# Altium footprint library Miscellaneous THD.PcbLib: 216 footprints (part 11 of 15) (continued)
## RADIALL_R694252107_a [mm] "COAXIPAK 2 Series, 6 Ways 50 ohm RF Coaxial Right Angle Jack Module" (continued)
Mechanical 14:
  lines w0.1: 5,-5.7 -2.8,-5.7 -2.8,-2.3 5,-2.3 ; 5,-3.4 16.55,-3.4 ; 5,-2.6 16.55,-2.6 ; 5,-1.7 -2.8,-1.7 -2.8,1.7 5,1.7 ; 5,2.3 -2.8,2.3 -2.8,5.7 5,5.7 ; 5,2.4 16.55,2.4 ; 5,3.6 16.55,3.6 ; 16.55,-5.975 16.55,5.975 ; 5,-5.975 17.45,-5.975 17.45,5.975 5,5.975 5,-5.975
  text "A" at 1.6,-7.3 h1
  text "B" at -0.564,-7.25 h1
  text "1C" at -4.95,-4.45 h1
  text "1B" at -4.95,-0.45 h1
  text "1A" at -4.95,3.55 h1
3D body "RADIALL_R694252107.stp": height 9.3, standoff -3.05, extent -2.8,-5.975 17.45,5.975

## ROXBURGH_RIX0142P [mm] "1A 250VAC PCB Mounted Inlet Filter IEC Connector"
height 25.2
pads (4):
  round 2.7 hole 2: 1(10.3,10.75) 3(-10.3,10.75)
  round 2.3 hole 1.6: 2(-9.3,-10.55) 2(9.3,-10.55)
Top Overlay:
  lines w0.2: -15,-16.45 -15,16.85 cw(c-13,16.85) -13,18.85 13,18.85 cw(c13,16.85) 15,16.85 15,-16.45 ; -14.75,-20.15 -14.75,-21.65 ccw(c-13.75,-21.65) -13.75,-22.65 13.75,-22.65 ccw(c13.75,-21.65) 14.75,-21.65 14.75,-20.15 ; -10.3,-13.357 -8.3,-13.357 ; -10,-13.757 -8.6,-13.757 ; -9.7,-14.157 -9,-14.157 ; -9.3,-13.357 -9.3,-12.757 ; 8.3,-13.357 10.3,-13.357 ; 8.6,-13.757 10,-13.757 ; 8.9,-14.157 9.6,-14.157 ; 9.3,-13.357 9.3,-12.757 ; -25,-20.15 25,-20.15 25,-16.45 -25,-16.45 -25,-20.15
  text "L" at 9.943,6.525 h1.5
  text "N" at -10.802,6.325 h1.5
Mechanical 8:
  lines w0.05: -10.8,10.75 -10.3,10.75 ; -10.3,10.25 -10.3,10.75 ; -10.3,11.25 -10.3,10.75 ; -9.8,-10.55 -9.3,-10.55 ; -9.8,10.75 -10.3,10.75 ; -9.3,-11.05 -9.3,-10.55 ; -9.3,-10.05 -9.3,-10.55 ; -8.8,-10.55 -9.3,-10.55 ; -0.5,0 0,0 ; 0,-0.5 0,0 ; 0,0.5 0,0 ; 0.5,0 0,0 ; 8.8,-10.55 9.3,-10.55 ; 9.3,-11.05 9.3,-10.55 ; 9.3,-10.05 9.3,-10.55 ; 9.8,-10.55 9.3,-10.55 ; 9.8,10.75 10.3,10.75 ; 10.3,10.25 10.3,10.75 ; 10.3,11.25 10.3,10.75 ; 10.8,10.75 10.3,10.75
Mechanical 14:
  lines w0.1: -15,-16.45 -15,16.85 cw(c-13,16.85) -13,18.85 13,18.85 cw(c13,16.85) 15,16.85 15,-16.45 ; -14.75,-20.15 -14.75,-21.65 ccw(c-13.75,-21.65) -13.75,-22.65 13.75,-22.65 ccw(c13.75,-21.65) 14.75,-21.65 14.75,-20.15 ; -10.3,-13.357 -8.3,-13.357 ; -10,-13.757 -8.6,-13.757 ; -9.7,-14.157 -9,-14.157 ; -9.3,-13.357 -9.3,-12.757 ; 8.3,-13.357 10.3,-13.357 ; 8.6,-13.757 10,-13.757 ; 8.9,-14.157 9.6,-14.157 ; 9.3,-13.357 9.3,-12.757 ; -25,-20.15 25,-20.15 25,-16.45 -25,-16.45 -25,-20.15
  text "L" at 9.943,6.525 h1.5
  text "N" at -10.802,6.325 h1.5
3D body "ROXBURGH_RIX0142P.stp": height 26.27, standoff -4.4, extent -25.013,-22.55 24.987,18.85

## SCHURTER_DD21.0121.1111 [mm] "IEC Appliance Inlet C14 with Line Switch 2-Pole, Fuseholder 2-Pole, for PCB Mounting"
height 32.3
pads (5):
  round 2.2 hole 1.5: 1(17.65,-9.55) 3(11.65,-9.55)
  round 2.4 hole 1.7: 2(-17.55,-9.55)
  round 5.8 hole 3.4: 4(-28,0) 5(28,0)
Top Overlay:
  drawing of 222 lines, arcs and shapes, not listed
  text "L" at 17.578,-12.875 h1.5
  text "N" at 11.025,-12.95 h1.5
  text "PE" at -18.375,-17.975 h1.5
Mechanical 8:
  circle w0.1: c17.65,-9.55 r0.65
  circle w0.1: c11.65,-9.55 r0.65
  circle w0.1: c-17.55,-9.55 r0.8
  circle w0.1: c28,0 r1.8
  circle w0.1: c-28,0 r1.8
  lines w0.1: -28.5,0 -28,0 ; -28,-0.5 -28,0 ; -28,0.5 -28,0 ; -27.5,0 -28,0 ; -18.05,-9.55 -17.55,-9.55 ; -17.55,-10.05 -17.55,-9.55 ; -17.55,-9.05 -17.55,-9.55 ; -17.05,-9.55 -17.55,-9.55 ; -0.5,0 0,0 ; 0,-0.5 0,0 ; 0,0.5 0,0 ; 0.5,0 0,0 ; 1.45,0.95 1.95,0.95 ; 1.95,0.45 1.95,0.95 ; 1.95,1.45 1.95,0.95 ; 2.45,0.95 1.95,0.95 ; 11.15,-9.55 11.65,-9.55 ; 11.65,-10.05 11.65,-9.55 ; 11.65,-9.05 11.65,-9.55 ; 12.15,-9.55 11.65,-9.55 ; 17.15,-9.55 17.65,-9.55 ; 17.65,-10.05 17.65,-9.55 ; 17.65,-9.05 17.65,-9.55 ; 18.15,-9.55 17.65,-9.55 ; 27.5,0 28,0 ; 28,-0.5 28,0 ; 28,0.5 28,0 ; 28.5,0 28,0
Mechanical 14:
  drawing of 258 lines, arcs and shapes, not listed
  text "L" at 17.578,-12.875 h1.5
  text "N" at 11.025,-12.95 h1.5
  text "PE" at -18.375,-17.975 h1.5
3D body "SCHURTER_DD21.0121.1111.stp": height 32.25, standoff -4.5, extent -32.5,-25.1 32.5,13.45

## SCHURTER_GSF1.1201.31 [mm] "IEC Appliance Inlet C14 with Fuseholder 1 Pole"
height 24.45
pads (5):
  round 2.3 hole 1.6: 1(-12.7,-5.5) 2(0,-9.9) 3(9.05,-9.9)
  round 1 hole 6 unplated mask+2.5: 4(-13.5,0) 5(13.5,0)
Top Overlay:
  circle w0.2: c0,-15.7 r0.7
  lines w0.2: -16.2,-5.3 -14.3,-5.3 ccw(c-14.3,-6.5) -14.867,-7.558 cw(c-15.06,-7.92) -14.724,-8.155 ccw(c-12.35,-9.82) -15.244,-9.64 ccw(c-12.35,-9.82) -15.018,-10.957 -13.546,-10.33 cw(c-12.35,-9.82) -13.647,-9.727 -14.845,-9.662 cw(c-12.35,-9.82) -14.397,-8.385 ccw(c-15.06,-7.92) -14.678,-7.205 cw(c-14.3,-6.5) -14.3,-5.7 ; -15.483,-6.7 -16.2,-6.7 -16.2,-3.8 16.2,-3.8 16.2,-6.7 13.75,-6.7 13.75,-5.3 ; -15.075,-6.7 -13.75,-6.7 ; -14.842,-6.7 -14.769,-7.148 ; -14.447,-6.7 -14.286,-7.682 ; -14.26,-5.848 -15.052,-6.305 -14.857,-6.643 -14.124,-6.22 ; -13.75,6 -13.75,7.6 ; -13.5,-3.8 -13.5,-3.581 ; -13.5,3.581 -13.5,4.5 ; -11.65,-6.7 -10.325,-6.7 ; -11.271,-6.223 -10.543,-6.643 -10.348,-6.305 -11.151,-5.842 ; -11.114,-7.682 -10.953,-6.7 ; -11.1,-5.7 cw(c-11.1,-6.5) -10.722,-7.205 ccw(c-10.34,-7.92) -11.003,-8.385 cw(c-13.05,-9.82) -10.75,-10.8 -10.382,-10.957 ccw(c-13.05,-9.82) -10.676,-8.155 cw(c-10.34,-7.92) -10.533,-7.558 ccw(c-11.1,-6.5) -11.1,-5.3 16.2,-5.3 ; -11,-5.3 cw(c-11,-6.5) -9.8,-6.5 -9.8,-8.5 ccw(c-8.8,-8.5) -9.25,-9.393 ; -10.631,-7.148 -10.558,-6.7 ; -10.2,-7.294 -10.2,-8.5 ccw(c-8.8,-8.5) -8.8,-9.9 -5,-9.9 -5,-9.5 ; -9.8,-6.7 -9.25,-6.7 ; -9.25,-9.826 -9.25,-10.5 -8.04,-10.5 ; -9.25,-5.3 -9.25,-9.5 -4.95,-9.5 ; -8,-10.1 -8.2,-12.1 -7.52,-12.1 -7.087,-11.35 cw(c-7,-11.4) -6.913,-11.35 -6.48,-12.1 -5.8,-12.1 -6,-10.1 ; -4.95,-5.3 -4.95,-13.3 -2.4,-13.3 ; -4,-13.3 -4,-5.3 ; -4,-9.5 -1.549,-9.5 ; -3.5,-13.3 -3.5,-9.5 ; -2.25,-10.75 -2.25,-5.3 ; -2,-9.5 -2,-10.5 -2.4,-10.9 -2.4,-18 ; -1,-12.03 1,-12.03 ; -0.7,-12.43 0.7,-12.43 ; -0.4,-12.83 0.3,-12.83 ; 0,-12.03 0,-11.506 ; 1.549,-9.5 4,-9.5 ; 2,-9.5 2,-10.5 2.4,-10.9 2.4,-18 ; 2.25,-10.75 2.25,-5.3 ; 2.4,-13.3 4.95,-13.3 4.95,-5.3 ; 3.5,-13.3 3.5,-9.5 ; 4,-13.3 4,-5.3 ; 4.95,-9.5 7.518,-9.5 ; 5,-9.5 5,-10.28 7.518,-10.28 ; 5.982,-10.28 5.8,-12.1 6.48,-12.1 6.913,-11.35 cw(c7,-11.4) 7.087,-11.35 7.52,-12.1 8.2,-12.1 8.109,-11.19 ; 9.25,-8.331 9.25,-5.3 ; 9.25,-6.7 11.65,-6.7 11.65,-5.3 ; 13.5,-3.8 13.5,-3.581 ; 13.5,3.581 13.5,4.5 ; 13.75,6 13.75,7.6 ; -2.4,-18 -1.5,-18.9 1.5,-18.9 2.4,-18 ; -2.4,-18 2.4,-18 ; -17,4.5 17,4.5 17,6 -17,6 -17,4.5 ; -14.95,7.6 14.95,7.6 14.95,10 ccw(c12.95,10) 12.95,12 -12.95,12 ccw(c-12.95,10) -14.95,10 -14.95,7.6
  text "N" at 10.7,-10.65 h1.5
  text "L" at -16.822,-8.9 h1.5
Mechanical 8:
  circle w0.1: c13.5,0 r3
  circle w0.1: c-13.5,0 r3
  circle w0.1: c-12.7,-5.5 r0.8
  circle w0.1: c9.05,-9.9 r0.8
  circle w0.1: c0,-9.9 r0.8
  circle w0.1: c-12.7,-9.545 r2.5
  lines w0.1: -14,0 -13.5,0 ; -13.5,-0.5 -13.5,0 ; -13.5,0.5 -13.5,0 ; -13.407,-10.252 -12.7,-9.545 ; -13.407,-8.838 -12.7,-9.545 ; -13.2,-5.5 -12.7,-5.5 ; -13,0 -13.5,0 ; -12.7,-6 -12.7,-5.5 ; -12.7,-5 -12.7,-5.5 ; -12.2,-5.5 -12.7,-5.5 ; -11.993,-10.252 -12.7,-9.545 ; -11.993,-8.838 -12.7,-9.545 ; -8.875,-4.425 -12.7,-8.25 -12.7,-9.545 ; -0.5,-9.9 0,-9.9 ; -0.5,0 0,0 ; 0,-10.4 0,-9.9 ; 0,-9.4 0,-9.9 ; 0,-0.5 0,0 ; 0,0.5 0,0 ; 0.5,-9.9 0,-9.9 ; 0.5,0 0,0 ; 8.55,-9.9 9.05,-9.9 ; 9.05,-10.4 9.05,-9.9 ; 9.05,-9.4 9.05,-9.9 ; 9.55,-9.9 9.05,-9.9 ; 13,0 13.5,0 ; 13.5,-0.5 13.5,0 ; 13.5,0.5 13.5,0 ; 14,0 13.5,0
  text "Must be 2mm" at -5.075,-5.95 h1
  text "3D Fuse (5X20) Stand-off Heigh" at -11.525,-3.975 h1
Mechanical 14:
  circle w0.1: c0,-15.7 r0.7
  lines w0.1: -16.2,-5.3 16.2,-5.3 ; -16.175,-1.243 -16.985,-1.243 cw(c-13.5,0) -16.985,1.243 -16.175,1.243 ; -15.483,-6.7 -16.2,-6.7 -16.2,-3.8 16.2,-3.8 16.2,-6.7 13.75,-6.7 13.75,-5.3 ; -15.075,-6.7 -13.75,-6.7 -13.75,-6.004 ; -14.842,-6.7 -14.769,-7.148 ; -14.447,-6.7 -14.286,-7.682 ; -14.3,-5.3 ccw(c-14.3,-6.5) -14.867,-7.558 cw(c-15.06,-7.92) -14.724,-8.155 ccw(c-12.35,-9.82) -15.244,-9.64 ccw(c-12.35,-9.82) -15.018,-10.957 -13.546,-10.33 cw(c-12.35,-9.82) -13.647,-9.727 -14.845,-9.662 cw(c-12.35,-9.82) -14.397,-8.385 ccw(c-15.06,-7.92) -14.678,-7.205 cw(c-14.3,-6.5) -14.3,-5.7 -11.1,-5.7 cw(c-11.1,-6.5) -10.722,-7.205 ccw(c-10.34,-7.92) -11.003,-8.385 cw(c-13.05,-9.82) -10.75,-10.8 -10.382,-10.957 ccw(c-13.05,-9.82) -10.676,-8.155 cw(c-10.34,-7.92) -10.533,-7.558 ccw(c-11.1,-6.5) -11.1,-5.3 ; -14.003,-5.7 -15.052,-6.305 -14.857,-6.643 -13.278,-5.732 cw(c-13.123,-6) -13.201,-5.7 ; -13.75,6 -13.75,7.6 ; -13.5,-3.8 -13.5,4.5 ; -13.5,-2.95 cw(c-13.5,0) -13.5,2.95 ; -12.199,-5.7 cw(c-12.277,-6) -12.122,-5.732 -10.543,-6.643 -10.348,-6.305 -11.397,-5.7 ; -11.65,-6.004 -11.65,-6.7 -10.325,-6.7 ; -11.114,-7.682 -10.953,-6.7 ; -11,-5.3 cw(c-11,-6.5) -9.8,-6.5 -9.8,-8.5 ccw(c-8.8,-8.5) -9.25,-9.393 ; -10.631,-7.148 -10.558,-6.7 ; -10.2,-7.294 -10.2,-8.5 ccw(c-8.8,-8.5) -8.8,-9.9 -5,-9.9 -5,-9.5 ; -9.8,-6.7 -9.25,-6.7 ; -9.25,-9.826 -9.25,-10.5 -8.04,-10.5 ; -9.25,-5.3 -9.25,-9.5 -4.95,-9.5 ; -8,-10.1 -8.2,-12.1 -7.52,-12.1 -7.087,-11.35 cw(c-7,-11.4) -6.913,-11.35 -6.48,-12.1 -5.8,-12.1 -6,-10.1 ; -4.95,-5.3 -4.95,-13.3 -2.4,-13.3 ; -4,-13.3 -4,-5.3 ; -4,-9.5 4,-9.5 ; -3.5,-13.3 -3.5,-9.5 ; -2.25,-10.75 -2.25,-5.3 ; -2,-9.5 -2,-10.5 -2.4,-10.9 -2.4,-18 ; -1,-12.03 1,-12.03 ; -0.7,-12.43 0.7,-12.43 ; -0.4,-12.83 0.3,-12.83 ; 0,-12.03 0,-11.43 ; 2,-9.5 2,-10.5 2.4,-10.9 2.4,-18 ; 2.25,-10.75 2.25,-5.3 ; 2.4,-13.3 4.95,-13.3 4.95,-5.3 ; 3.5,-13.3 3.5,-9.5 ; 4,-13.3 4,-5.3 ; 4.95,-9.5 9,-9.5 9,-10.28 5,-10.28 5,-9.5 ; 5.982,-10.28 5.8,-12.1 6.48,-12.1 6.913,-11.35 cw(c7,-11.4) 7.087,-11.35 7.52,-12.1 8.2,-12.1 8.018,-10.28 ; 8.04,-10.5 9.25,-10.5 9.25,-5.3 ; 9.25,-10.28 9.7,-10.28 9.7,-9.5 9.25,-9.5 ; 9.25,-6.7 11.65,-6.7 11.65,-5.3 ; 13.5,-3.8 13.5,4.5 ; 13.5,-2.95 ccw(c13.5,0) 13.5,2.95 ; 13.75,6 13.75,7.6 ; 16.175,-1.243 16.985,-1.243 ccw(c13.5,0) 16.985,1.243 16.175,1.243 ; -2.4,-18 -1.5,-18.9 1.5,-18.9 2.4,-18 ; -2.4,-18 2.4,-18 ; -17,4.5 17,4.5 17,6 -17,6 -17,4.5 ; -14.95,7.6 14.95,7.6 14.95,10 ccw(c12.95,10) 12.95,12 -12.95,12 ccw(c-12.95,10) -14.95,10 -14.95,7.6
  text "N" at 10.7,-10.65 h1.5
  text "L" at -16.822,-8.9 h1.5
3D body "SCHURTER_GSF1.1201.31.stp": height 24.45, standoff -4.55, extent -17.176,-18.9 17.176,12

## SCHURTER_GSF1.2202.31 [mm] "IEC Appliance Inlet C14 with 2 Pole Fuseholder"
height 24.45
pads (5):
  round 2.1 hole 1.4: 1(-12.7,-5.5) 3(12.7,-5.5)
  round 2.3 hole 1.6: 2(0,-9.9)
  round 1 hole 6 unplated mask+2.5: 4(-13.5,0) 5(13.5,0)
Top Overlay:
  drawing of 178 lines, arcs and shapes, not listed
  text "L" at -16.797,-8.925 h1.5
  text "N" at 15.9,-8.95 h1.5
Mechanical 8:
  circle w0.1: c-12.7,-9.545 r2.5
  circle w0.1: c12.7,-9.545 r2.5
  lines w0.1: -14.5,0 -13.5,0 ; -13.7,-5.5 -12.7,-5.5 ; -13.5,-1 -13.5,0 ; -13.5,1 -13.5,0 ; -13.407,-10.252 -12.7,-9.545 ; -13.407,-8.838 -12.7,-9.545 ; -12.7,-6.5 -12.7,-5.5 ; -12.7,-4.5 -12.7,-5.5 ; -12.5,0 -13.5,0 ; -11.993,-10.252 -12.7,-9.545 ; -11.993,-8.838 -12.7,-9.545 ; -11.7,-5.5 -12.7,-5.5 ; -8.875,-4.425 -12.7,-8.25 -12.7,-9.545 ; -1,-9.9 0,-9.9 ; -1,0 0,0 ; 0,-10.9 0,-9.9 ; 0,-8.9 0,-9.9 ; 0,-1 0,0 ; 0,1 0,0 ; 1,-9.9 0,-9.9 ; 1,0 0,0 ; 8.875,-4.425 12.7,-8.25 12.7,-9.545 ; 11.7,-5.5 12.7,-5.5 ; 11.993,-10.252 12.7,-9.545 ; 11.993,-8.838 12.7,-9.545 ; 12.5,0 13.5,0 ; 12.7,-6.5 12.7,-5.5 ; 12.7,-4.5 12.7,-5.5 ; 13.407,-10.252 12.7,-9.545 ; 13.407,-8.838 12.7,-9.545 ; 13.5,-1 13.5,0 ; 13.5,1 13.5,0 ; 13.7,-5.5 12.7,-5.5 ; 14.5,0 13.5,0
  text "Must be 2mm" at -5.075,-5.95 h1
  text "3D Fuse (5X20) Stand-off Heigh" at -11.525,-3.975 h1
Mechanical 14:
  drawing of 175 lines, arcs and shapes, not listed
  text "L" at -16.797,-8.925 h1.5
  text "N" at 15.9,-8.95 h1.5
3D body "SCHURTER_GSF1.2202.31.stp": height 24.45, standoff -4.55, extent -17.176,-13.3 17.176,12

## SFH250V [mm] "100MBd Analog Receiver Diode with Direct Fiber Connector"
height 9
pads (4):
  round 1.7 hole 1: 1(0,1.27) 2(0,-1.27) 3(7.62,-2.54) 4(7.62,2.54)
Top Overlay:
  lines w0.2: -1.852,-0.254 -0.836,-0.254 ; -1.344,-0.635 -1.344,-0.254 ; -1.344,0.254 -1.344,0.635 ; -0.5,-3.617 -0.5,-4.6 13,-4.6 13,4.6 -0.5,4.6 -0.5,3.534 ; 13,-2.9 14,-2.9 ; 13,2.9 14,2.9 ; -1.344,-0.254 -0.836,0.254 -1.852,0.254 -1.344,-0.254 ; 23.5,-3.5 23.7,-3.3 23.7,3.3 23.5,3.5 ; 23.5,-3.5 23.5,3.5 ; 23.5,-3.5 14,-3.5 14,3.5 23.5,3.5
Mechanical 8:
  lines w0.1: -1,-1.27 0,-1.27 ; -1,0 0,0 ; -1,1.27 0,1.27 ; 0,-2.27 0,-1.27 ; 0,-1 0,0 ; 0,-0.27 0,-1.27 ; 0,0.27 0,1.27 ; 0,1 0,0 ; 0,2.27 0,1.27 ; 1,-1.27 0,-1.27 ; 1,0 0,0 ; 1,1.27 0,1.27 ; 6.62,-2.54 7.62,-2.54 ; 6.62,2.54 7.62,2.54 ; 7.62,-3.54 7.62,-2.54 ; 7.62,-1.54 7.62,-2.54 ; 7.62,1.54 7.62,2.54 ; 7.62,3.54 7.62,2.54 ; 8.62,-2.54 7.62,-2.54 ; 8.62,2.54 7.62,2.54
Mechanical 14:
  lines w0.1: -1.344,-0.635 -1.344,-0.254 ; -1.344,0.254 -1.344,0.635 ; 13,-2.9 14,-2.9 ; 13,2.9 14,2.9 ; -1.852,-0.254 -0.836,-0.254 ; -1.852,-0.254 -0.836,-0.254 ; -1.852,-0.254 -0.836,-0.254 ; -1.852,0.254 -0.836,0.254 ; -1.852,0.254 -1.344,-0.254 ; -1.852,0.254 -1.344,-0.254 ; -1.852,0.254 -0.836,0.254 ; -1.852,0.254 -0.836,0.254 ; -1.852,0.254 -1.344,-0.254 ; -1.344,-0.254 -0.836,0.254 ; -1.344,-0.254 -0.836,0.254 ; -1.344,-0.254 -0.836,0.254 ; 23.5,-3.5 23.7,-3.3 23.7,3.3 23.5,3.5 ; 23.5,-3.5 23.5,3.5 ; 23.5,-3.5 14,-3.5 14,3.5 23.5,3.5 ; -0.5,-4.6 -0.5,4.6 13,4.6 13,-4.6 -0.5,-4.6
3D body "SFH250V.stp": height 8.6, standoff -3.6, extent -0.5,-4.6 23.7,4.6

## SFH350V [mm] "Plastic Connector Housing For Plastic Fiber Optic Phototransistor Detector"
height 9
pads (2):
  round 1.7 hole 1: 4(7.62,-2.54) 5(7.62,2.54)
Top Overlay:
  lines w0.2: -0.5,-3.617 -0.5,-4.6 13,-4.6 13,4.6 -0.5,4.6 -0.5,3.534 ; 13,-2.9 14,-2.9 ; 13,2.9 14,2.9 ; 23.5,-3.5 23.7,-3.3 23.7,3.3 23.5,3.5 ; 23.5,-3.5 23.5,3.5 ; 23.5,-3.5 14,-3.5 14,3.5 23.5,3.5
Mechanical 8:
  lines w0.1: -1,-2.582 0,-2.582 ; -1,0 0,0 ; -1,2.498 0,2.498 ; 0,-3.582 0,-2.582 ; 0,-1.582 0,-2.582 ; 0,-1 0,0 ; 0,1 0,0 ; 0,1.498 0,2.498 ; 0,3.498 0,2.498 ; 1,-2.582 0,-2.582 ; 1,0 0,0 ; 1,2.498 0,2.498 ; 6.62,-2.54 7.62,-2.54 ; 6.62,2.54 7.62,2.54 ; 7.62,-3.54 7.62,-2.54 ; 7.62,-1.54 7.62,-2.54 ; 7.62,1.54 7.62,2.54 ; 7.62,3.54 7.62,2.54 ; 8.62,-2.54 7.62,-2.54 ; 8.62,2.54 7.62,2.54
Mechanical 14:
  lines w0.1: 13,-2.9 14,-2.9 ; 13,2.9 14,2.9 ; 23.5,-3.5 23.7,-3.3 23.7,3.3 23.5,3.5 ; 23.5,-3.5 23.5,3.5 ; 23.5,-3.5 14,-3.5 14,3.5 23.5,3.5 ; -0.5,-4.6 -0.5,4.6 13,4.6 13,-4.6 -0.5,-4.6
3D body "SFH350V.stp": height 8.6, standoff -3.6, extent -0.5,-4.6 23.7,4.6

## SFH756V [mm] "10MBd Transmitter with Direct Fiber Connector"
height 9
pads (4):
  round 1.7 hole 1: 1(0,1.27) 2(0,-1.27) 3(7.62,-2.54) 4(7.62,2.54)
Top Overlay:
  lines w0.2: -1.852,-0.254 -0.836,-0.254 ; -1.344,-0.635 -1.344,-0.254 ; -1.344,0.254 -1.344,0.635 ; -0.5,-3.617 -0.5,-4.6 13,-4.6 13,4.6 -0.5,4.6 -0.5,3.534 ; 13,-2.9 14,-2.9 ; 13,2.9 14,2.9 ; -1.344,-0.254 -0.836,0.254 -1.852,0.254 -1.344,-0.254 ; 23.5,-3.5 23.7,-3.3 23.7,3.3 23.5,3.5 ; 23.5,-3.5 23.5,3.5 ; 23.5,-3.5 14,-3.5 14,3.5 23.5,3.5
Mechanical 8:
  lines w0.1: -1,-1.27 0,-1.27 ; -1,0 0,0 ; -1,1.27 0,1.27 ; 0,-2.27 0,-1.27 ; 0,-1 0,0 ; 0,-0.27 0,-1.27 ; 0,0.27 0,1.27 ; 0,1 0,0 ; 0,2.27 0,1.27 ; 1,-1.27 0,-1.27 ; 1,0 0,0 ; 1,1.27 0,1.27 ; 6.62,-2.54 7.62,-2.54 ; 6.62,2.54 7.62,2.54 ; 7.62,-3.54 7.62,-2.54 ; 7.62,-1.54 7.62,-2.54 ; 7.62,1.54 7.62,2.54 ; 7.62,3.54 7.62,2.54 ; 8.62,-2.54 7.62,-2.54 ; 8.62,2.54 7.62,2.54
Mechanical 14:
  lines w0.1: -1.344,-0.635 -1.344,-0.254 ; -1.344,0.254 -1.344,0.635 ; 13,-2.9 14,-2.9 ; 13,2.9 14,2.9 ; -1.852,-0.254 -0.836,-0.254 ; -1.852,-0.254 -0.836,-0.254 ; -1.852,-0.254 -0.836,-0.254 ; -1.852,0.254 -0.836,0.254 ; -1.852,0.254 -1.344,-0.254 ; -1.852,0.254 -1.344,-0.254 ; -1.852,0.254 -0.836,0.254 ; -1.852,0.254 -0.836,0.254 ; -1.852,0.254 -1.344,-0.254 ; -1.344,-0.254 -0.836,0.254 ; -1.344,-0.254 -0.836,0.254 ; -1.344,-0.254 -0.836,0.254 ; 23.5,-3.5 23.7,-3.3 23.7,3.3 23.5,3.5 ; 23.5,-3.5 23.5,3.5 ; 23.5,-3.5 14,-3.5 14,3.5 23.5,3.5 ; -0.5,-4.6 -0.5,4.6 13,4.6 13,-4.6 -0.5,-4.6
3D body "SFH756V.stp": height 8.6, standoff -3.6, extent -0.5,-4.6 23.7,4.6

## SKS-HIRSCHMANN_930 103-100 [mm] "Black Socket For Banana 4mm"
height 26.5
Top Layer keep-out:
  circle w0.1: c0,0 r6.5
Bottom Layer keep-out:
  circle w0.1: c0,0 r6.5
Top Overlay:
  circle w0.2: c0,0 r7
Keep-Out Layer:
  board cut-out: -1.219,-3.281 -1.474,-3.186 -1.947,-2.921 -2.374,-2.586 -2.744,-2.189 -3.049,-1.74 -3.281,-1.249 -3.434,-0.728 -3.505,-0.19 -3.493,0.352 -3.397,0.886 -3.219,1.399 -2.965,1.879 -2.64,2.314 -2.252,2.693 -1.81,3.008 -1.325,3.251 -0.808,3.416 -0.271,3.5 0.271,3.5 0.808,3.416 1.325,3.251 1.81,3.008 2.252,2.693 2.64,2.314 2.965,1.879 3.22,1.399 3.397,0.886 3.493,0.352 3.505,-0.19 3.434,-0.728 3.281,-1.249 3.049,-1.74 2.744,-2.189 2.374,-2.586 1.947,-2.921 1.474,-3.186 1.219,-3.281 0,-4.5
Mechanical 1:
  lines w1.27: -1.219,-3.281 cw(c0,0) 1.219,-3.281 0,-4.5 -1.219,-3.281
Mechanical 8:
  circle w0.1: c0,0 r6.5
Mechanical 14:
  circle w0.1: c0,0 r2
  circle w0.1: c0,0 r3.4
  circle w0.1: c0,0 r7
  lines w0.1: -6.994,0.281 cw(c-6.894,-1.216) -6.476,-2.656 ; -6.669,2.128 ccw(c-6.062,3.5) -5.177,4.711 ; -5.539,-4.281 cw(c-4.499,-5.362) -3.254,-6.198 ; -3.741,5.917 ccw(c-2.394,6.578) -0.938,6.937 ; -1.491,-6.839 cw(c0,-7) 1.491,-6.839 ; -1.23,-3.17 0,-4.4 1.231,-3.17 ; 0.938,6.937 ccw(c2.394,6.578) 3.741,5.917 ; 3.254,-6.198 cw(c4.5,-5.362) 5.539,-4.281 ; 5.177,4.711 ccw(c6.062,3.5) 6.669,2.128 ; 6.476,-2.656 cw(c6.894,-1.216) 6.994,0.281
Drill Drawing:
  lines w0.1: -2.325,-5.497 -1.419,-5.919 ; -1.842,-5.013 -1.419,-5.919 ; -1.758,-6.258 -0.2,-4.7 ; -1.297,-1.175 1.175,-1.175 2.475,-2.475 ; -0.5,0 0,0 ; 0,-0.5 0,0 ; 0,0.5 0,0 ; 0.2,-4.7 1.758,-6.258 ; 0.5,-4.5 5,-4.5 ; 0.5,0 0,0 ; 0.7,3.5 5,3.5 ; 1.569,-2.052 2.475,-2.475 ; 1.842,-5.013 1.419,-5.919 ; 2.052,-1.569 2.475,-2.475 ; 2.326,-5.497 1.419,-5.919 ; 4.158,-3.56 4.5,-4.5 ; 4.158,2.56 4.5,3.5 ; 4.842,-3.56 4.5,-4.5 ; 4.842,2.56 4.5,3.5 ; -1.419,-5.919 ccw(c0,-3.836) 1.419,-5.919 ; 4.5,-4.5 4.5,3.5 ; -1.219,-3.281 cw(c0,0) 1.219,-3.281 0,-4.5 -1.219,-3.281
  text "90" at -4,-5.04 h1
  text "8" at 4.25,1.55 h1
  text "r3.5" at -2.35,-2.425 h1
3D body "SKS-HIRSCHMANN_930 103-100_Part1.stp": height 26.3, standoff -15.2, extent -6.961,-6.965 6.966,6.965
3D body "SKS-HIRSCHMANN_930 103-100_Part2.stp": height -1.6, standoff -7.1, extent -6.151,-6.188 6.2,6.188
3D body "SKS-HIRSCHMANN_930 103-100_Part3.stp": height -7.1, standoff -10.3, extent -3.5,-4.041 3.5,4.042
3D body "SKS-HIRSCHMANN_930 103-100_Part4.stp": height -10.3, standoff -13.5, extent -3.904,-3.904 3.904,3.904

## SKS-HIRSCHMANN_930 103-188 [mm] "Green/Yellow Socket For Banana 4mm"
height 26.5
Top Layer keep-out:
  circle w0.1: c0,0 r6.5
Bottom Layer keep-out:
  circle w0.1: c0,0 r6.5
Top Overlay:
  circle w0.2: c0,0 r7
Keep-Out Layer:
  board cut-out: -1.219,-3.281 -1.474,-3.186 -1.947,-2.921 -2.374,-2.586 -2.744,-2.189 -3.049,-1.74 -3.281,-1.249 -3.434,-0.728 -3.505,-0.19 -3.493,0.352 -3.397,0.886 -3.219,1.399 -2.965,1.879 -2.64,2.314 -2.252,2.693 -1.81,3.008 -1.325,3.251 -0.808,3.416 -0.271,3.5 0.271,3.5 0.808,3.416 1.325,3.251 1.81,3.008 2.252,2.693 2.64,2.314 2.965,1.879 3.22,1.399 3.397,0.886 3.493,0.352 3.505,-0.19 3.434,-0.728 3.281,-1.249 3.049,-1.74 2.744,-2.189 2.374,-2.586 1.947,-2.921 1.474,-3.186 1.219,-3.281 0,-4.5
Mechanical 1:
  lines w1.27: -1.219,-3.281 cw(c0,0) 1.219,-3.281 0,-4.5 -1.219,-3.281
Mechanical 8:
  circle w0.1: c0,0 r6.5
Mechanical 14:
  circle w0.1: c0,0 r2
  circle w0.1: c0,0 r3.4
  circle w0.1: c0,0 r7
  lines w0.1: -6.994,0.281 cw(c-6.894,-1.216) -6.476,-2.656 ; -6.669,2.128 ccw(c-6.062,3.5) -5.177,4.711 ; -5.539,-4.281 cw(c-4.499,-5.362) -3.254,-6.198 ; -3.741,5.917 ccw(c-2.394,6.578) -0.938,6.937 ; -1.491,-6.839 cw(c0,-7) 1.491,-6.839 ; -1.23,-3.17 0,-4.4 1.231,-3.17 ; 0.938,6.937 ccw(c2.394,6.578) 3.741,5.917 ; 3.254,-6.198 cw(c4.5,-5.362) 5.539,-4.281 ; 5.177,4.711 ccw(c6.062,3.5) 6.669,2.128 ; 6.476,-2.656 cw(c6.894,-1.216) 6.994,0.281
Drill Drawing:
  lines w0.1: -2.325,-5.497 -1.419,-5.919 ; -1.842,-5.013 -1.419,-5.919 ; -1.758,-6.258 -0.2,-4.7 ; -1.297,-1.175 1.175,-1.175 2.475,-2.475 ; -0.5,0 0,0 ; 0,-0.5 0,0 ; 0,0.5 0,0 ; 0.2,-4.7 1.758,-6.258 ; 0.5,-4.5 5,-4.5 ; 0.5,0 0,0 ; 0.7,3.5 5,3.5 ; 1.569,-2.052 2.475,-2.475 ; 1.842,-5.013 1.419,-5.919 ; 2.052,-1.569 2.475,-2.475 ; 2.326,-5.497 1.419,-5.919 ; 4.158,-3.56 4.5,-4.5 ; 4.158,2.56 4.5,3.5 ; 4.842,-3.56 4.5,-4.5 ; 4.842,2.56 4.5,3.5 ; -1.419,-5.919 ccw(c0,-3.836) 1.419,-5.919 ; 4.5,-4.5 4.5,3.5 ; -1.219,-3.281 cw(c0,0) 1.219,-3.281 0,-4.5 -1.219,-3.281
  text "90" at -4,-5.04 h1
  text "8" at 4.25,1.55 h1
  text "r3.5" at -2.35,-2.425 h1
3D body "SKS-HIRSCHMANN_930 103-188_Part4.stp": height -7.1, standoff -10.3, extent -3.5,-4.041 3.5,4.042
3D body "SKS-HIRSCHMANN_930 103-188_Part3.stp": height -10.3, standoff -13.5, extent -3.904,-3.904 3.904,3.904
3D body "SKS-HIRSCHMANN_930 103-188_Part2.stp": height -1.6, standoff -7.1, extent -6.151,-6.188 6.2,6.188
3D body "SKS-HIRSCHMANN_930 103-188_Part1.stp": height 26.3, standoff -15.2, extent -6.942,-6.95 6.959,6.953

## SKS-HIRSCHMANN_930 176-100 [mm] "Black Socket For Banana 4mm"
height 9.3
pads (1):
  round 10.5 hole 6.2: 1(0,0)
Top Overlay:
  circle w0.2: c0,0 r5.5
Bottom Overlay:
  circle w0.2: c0,0 r8
Mechanical 14:
  circle w0.1: c0.003,-0.002 r3
  circle w0.1: c0,0 r2
  circle w0.1: c0,0 r5
3D body "SKS-HIRSCHMANN_930 176-100_Part1.stp": height 9.3, standoff -14.2, extent -5,-4.997 5,4.997
3D body "SKS-HIRSCHMANN_930 176-100_Part2.stp": height -1.6, standoff -5.6, extent -4.347,-4.5 4.347,4.5